# Altium integrated library PAT_Library.IntLib: 45 symbols (part 2 of 2)

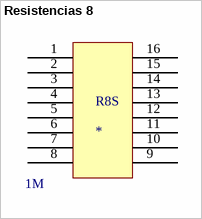
[diagram p23: symbol Resistencias 8]

## Resistencias 8
designator R8S  Resistencia: 1M
Resistor Network, 8 Isolated
footprint MatrixResistance
pins: 1, 2, 3, 4, 5, 6, 7, 8, 9, 10, 11, 12, 13, 14, 15, 16


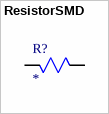
[diagram p24: symbol ResistorSMD]

## ResistorSMD
designator R?
Chip Resistor SMD
footprint ResistorSMD1206
footprint ResistorSMD0805
pins: 1, 2


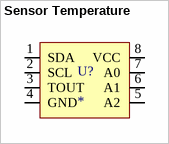
[diagram p25: symbol Sensor Temperature]

## Sensor Temperature
designator U?
Sensor I2C Temperature; Digi-Key Part Number: DS1631AU+CT-ND
footprint 8TSSOP (Sensor Temperature 8TSSOP, 8-MSOP)
pins: 1 SDA, 2 SCL, 3 TOUT, 4 GND, 5 A2, 6 A1, 7 A0, 8 VCC


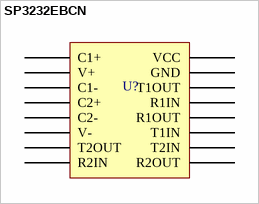
[diagram p26: symbol SP3232EBCN]

## SP3232EBCN
designator U?  (value not drawn)
Serial Adapter RS232; Digi-Key Part Number: 1016-1803-1-ND
footprint SP3232EBCN
pins: 1 C1+, 2 V+, 3 C1-, 4 C2+, 5 C2-, 6 V-, 7 T2OUT, 8 R2IN, 9 R2OUT, 10 T2IN, 11 T1IN, 12 R1OUT, 13 R1IN, 14 T1OUT, 15 GND, 16 VCC


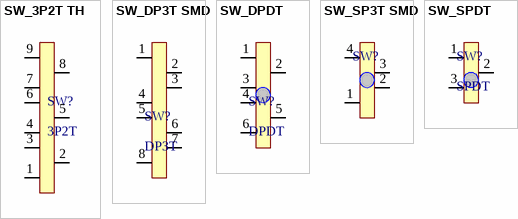
[diagram p27: symbols SW_3P2T TH to SW_SPDT]

## SW_3P2T TH
designator SW?, comment 3P2T
500mA 125V; Digi-Key Part Number: CWI359-ND
footprint 3P2T TH
pins: 1, 2, 3, 4, 5, 6, 7, 8, 9

## SW_DP3T SMD
designator SW?, comment DP3T
200mA 12V; Digi-Key Part Number: 563-1354-1-ND
footprint DP3T SMD
pins: 1, 2, 3, 4, 5, 6, 7, 8

## SW_DPDT
designator SW?, comment DPDT
200mA 12V; Digi-Key Part Number: 563-1343-1-ND
footprint DPDT SMD
pins: 1, 2, 3, 4, 5, 6

## SW_SP3T SMD
designator SW?, comment SP3T  (value not drawn)
200mA 12V; Digi-Key Part Number: 563-1330-1-ND
footprint SP3T SMD
pins: 1, 2, 3, 4

## SW_SPDT
designator SW?, comment SPDT
200mA 12V; Digi-Key Part Number: 563-1318-1-ND
footprint SPDT SMD
pins: 1, 2, 3


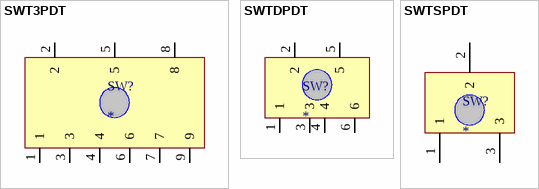
[diagram p28: symbols SWT3PDT to SWTSPDT]

## SWT3PDT
designator SW?
Toggle Switch Miniature 3PDT ON-ON; Digi-Key Part Number: 360-1864-ND
footprint SWITCHTOGGLE3PDT (Toggle Switch 3PDT Miniature)
pins: 1, 2, 3, 4, 5, 6, 7, 8, 9

## SWTDPDT
designator SW?
Toggle Switch DPDT Miniature; Digi-Key Part Number: 563-1164-ND
footprint SWITCHTOGGLEDPDT (Switch Toggle DPDT)
pins: 1, 2, 3, 4, 5, 6

## SWTSPDT
designator SW?
Toggle Switch Miniature; Digi-Key Part Number: 563-1159-ND
footprint SwitchToggle (Toggle Switch SPDT)
pins: 1, 2, 3


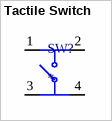
[diagram p29: symbol Tactile Switch]

## Tactile Switch
designator SW?
Switch Contact
footprint TactileSwitch
pins: 1, 2, 3, 4


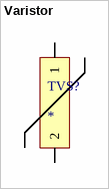
[diagram p30: symbol Varistor]

## Varistor
designator TVS?
Varistor SMD; Digi-Key Part Number: P7347CT-ND
footprint SMD (Package 2-SMD 30V)
footprint 0805 (Surface Mount 0805)
pins: 1, 2